# Altium footprint library Library 3D.PcbLib: 288 footprints (part 6 of 18)
Each footprint in its own frame and in the unit in brackets; x right, y up, seen from the top. Pads: shape width x height; smd on the part's side, far side on the other; paste and mask are expansions set on the pad; w line width, h text height; cw(c..) or ccw(c..) is an arc to the next point about the centre after c.
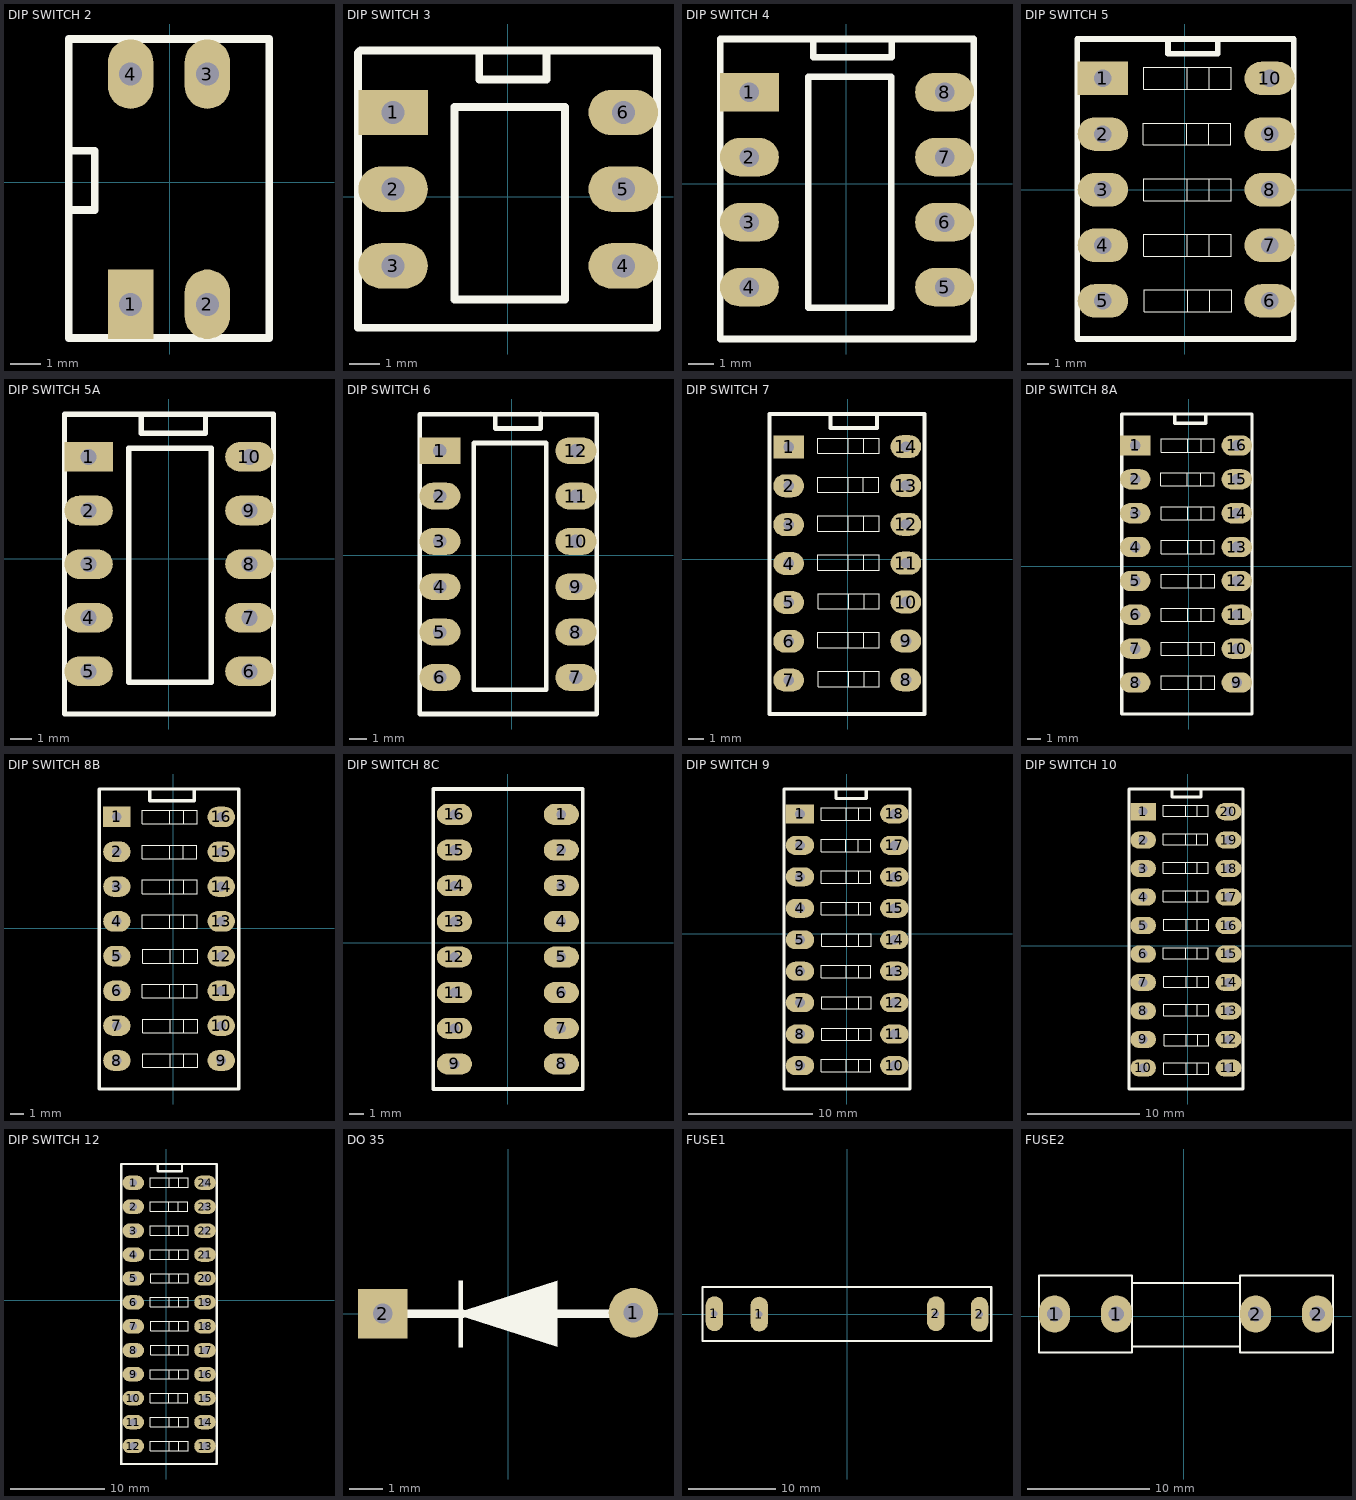
[diagram p5: the footprints below, top view; thin cyan lines are the x and y axes]

## DIP SWITCH 2 [mm]
pads (4):
  rect 1.5x2.3 hole 0.762: 1(-1.29,-4.04)
  oval 1.5x2.3 hole 0.762: 2(1.25,-4.04) 3(1.25,3.58) 4(-1.29,3.58)
Top Overlay:
  lines w0.254: -3.34,-0.916 -2.484,-0.916 -2.484,1.04 -3.34,1.04 ; -3.34,-5.154 -3.34,4.746 3.3,4.746 3.3,-5.154 -3.34,-5.154
3D body "DIP SWITCH 2.STEP": height 7.2, standoff -3, extent -3.34,-5.154 3.3,4.746

## DIP SWITCH 3 [mm]
pads (6):
  rect 2.3x1.5 hole 0.762: 1(-3.79,2.79)
  oval 2.3x1.5 hole 0.762: 2(-3.79,0.25) 3(-3.79,-2.29) 4(3.83,-2.29) 5(3.83,0.25) 6(3.83,2.79)
Top Overlay:
  lines w0.254: -0.945,4.797 -0.945,3.882 1.29,3.882 1.29,4.847 ; -4.955,-4.34 -4.955,4.759 -4.875,4.84 4.945,4.84 4.945,-4.34 -4.955,-4.34 ; -1.758,-3.408 -1.758,2.968 1.9,2.968 1.9,-3.408 -1.758,-3.408
3D body "DIP SWITCH 3.STEP": height 7.2, standoff -3, extent -4.955,-4.34 4.945,4.84

## DIP SWITCH 4 [mm]
pads (8):
  rect 2.3x1.5 hole 0.762: 1(-3.79,3.58)
  oval 2.3x1.5 hole 0.762: 2(-3.79,1.04) 3(-3.79,-1.5) 4(-3.79,-4.04) 5(3.83,-4.04) 6(3.83,-1.5) 7(3.83,1.04) 8(3.83,3.58)
Top Overlay:
  lines w0.254: -1.25,5.655 -1.301,5.604 -1.301,4.952 1.773,4.952 1.773,5.655 ; -4.93,-6.065 -4.93,5.655 4.97,5.655 4.97,-6.065 -4.93,-6.065 ; -1.5,-4.853 1.75,-4.853 1.75,4.19 -1.5,4.19 -1.5,-4.853
3D body "DIP SWITCH 4.STEP": height 7.2, standoff -3, extent -4.93,-6.065 4.97,5.655

## DIP SWITCH 5 [mm]
pads (10):
  rect 2.3x1.53 hole 0.8: 1(-3.75,5.08)
  oval 2.3x1.53 hole 0.8: 2(-3.75,2.54) 3(-3.75,0) 4(-3.75,-2.54) 5(-3.75,-5.08) 6(3.87,-5.08) 7(3.87,-2.54) 8(3.87,0) 9(3.87,2.54) 10(3.87,5.08)
Top Overlay:
  lines w0.038: 0.087,2.04 0.087,3.04 ; 0.112,-3.04 0.112,-2.04 ; 0.112,-0.5 0.112,0.5 ; 0.112,4.58 0.112,5.58 ; 0.137,-5.58 0.137,-4.58 ; 1.087,2.04 1.087,3.04 ; 1.112,-3.04 1.112,-2.04 ; 1.112,-0.5 1.112,0.5 ; 1.112,4.58 1.112,5.58 ; 1.137,-5.58 1.137,-4.58 ; -1.913,2.04 -1.913,3.04 2.087,3.04 2.087,2.04 -1.913,2.04 ; -1.888,-3.04 -1.888,-2.04 2.112,-2.04 2.112,-3.04 -1.888,-3.04 ; -1.888,-0.5 -1.888,0.5 2.112,0.5 2.112,-0.5 -1.888,-0.5 ; -1.888,4.58 -1.888,5.58 2.112,5.58 2.112,4.58 -1.888,4.58 ; -1.863,-5.58 -1.863,-4.58 2.137,-4.58 2.137,-5.58 -1.863,-5.58
  lines w0.254: -0.775,6.855 -0.775,6.205 1.5,6.205 1.5,6.88 ; -4.925,-6.82 -4.925,6.88 4.975,6.88 4.975,-6.82 -4.925,-6.82
3D body "User Library-DIP-8.STEP": height 7, standoff -3.7, extent -4.925,-6.82 4.975,6.88

## DIP SWITCH 5A [mm]
pads (10):
  rect 2.3x1.4 hole 0.762: 1(-3.79,4.83)
  oval 2.3x1.4 hole 0.762: 2(-3.79,2.29) 3(-3.79,-0.25) 4(-3.79,-2.79) 5(-3.79,-5.33) 6(3.83,-5.33) 7(3.83,-2.79) 8(3.83,-0.25) 9(3.83,2.29) 10(3.83,4.83)
Top Overlay:
  lines w0.254: -1.301,6.85 -1.301,5.948 1.747,5.948 1.747,6.862 ; -4.93,-7.35 4.97,-7.35 4.97,6.85 -4.93,6.85 -4.93,-7.35 ; -1.885,-5.838 2.027,-5.838 2.027,5.236 -1.885,5.236 -1.885,-5.838
3D body "DIP SWITCH 5.STEP": height 7.2, standoff -3, extent -4.93,-7.35 4.97,6.85

## DIP SWITCH 6 [mm]
pads (12):
  rect 2.3x1.5 hole 0.762: 1(-4.04,5.87)
  oval 2.3x1.5 hole 0.762: 2(-4.04,3.33) 3(-4.04,0.79) 4(-4.04,-1.75) 5(-4.04,-4.29) 6(-4.04,-6.83) 7(3.58,-6.83) 8(3.58,-4.29) 9(3.58,-1.75) 10(3.58,0.79) 11(3.58,3.33) 12(3.58,5.87)
Top Overlay:
  lines w0.254: -0.941,7.902 -0.941,7.115 1.624,7.115 1.624,7.927 ; -5.155,-8.88 4.746,-8.88 4.746,7.92 -5.155,7.92 -5.155,-8.88 ; -2.135,-7.516 1.929,-7.516 1.929,6.302 -2.135,6.302 -2.135,-7.516
3D body "DIP SWITCH 6.STEP": height 7.2, standoff -3, extent -5.155,-8.88 4.746,7.92

## DIP SWITCH 7 [mm]
pads (14):
  rect 2x1.5 hole 0.7: 1(-3.875,7.35)
  oval 2x1.5 hole 0.7: 2(-3.875,4.81) 3(-3.875,2.27) 4(-3.875,-0.27) 5(-3.875,-2.81) 6(-3.875,-5.35) 7(-3.875,-7.89) 8(3.79,-7.87) 9(3.79,-5.33) 10(3.79,-2.79) 11(3.79,-0.25) 12(3.79,2.29) 13(3.79,4.83) 14(3.79,7.37)
Top Overlay:
  lines w0.038: 0.012,4.385 0.012,5.385 ; 0.037,-5.775 0.037,-4.775 ; 0.037,-0.695 0.037,0.305 ; 0.037,1.845 0.037,2.845 ; 0.037,6.925 0.037,7.925 ; 0.062,-8.315 0.062,-7.315 ; 0.062,-3.235 0.062,-2.235 ; 1.012,4.385 1.012,5.385 ; 1.037,-5.775 1.037,-4.775 ; 1.037,-0.695 1.037,0.305 ; 1.037,1.845 1.037,2.845 ; 1.037,6.925 1.037,7.925 ; 1.062,-8.315 1.062,-7.315 ; 1.062,-3.235 1.062,-2.235 ; -1.988,4.385 2.012,4.385 2.012,5.385 -1.988,5.385 -1.988,4.385 ; -1.963,-5.775 2.037,-5.775 2.037,-4.775 -1.963,-4.775 -1.963,-5.775 ; -1.963,-0.695 2.037,-0.695 2.037,0.305 -1.963,0.305 -1.963,-0.695 ; -1.963,1.845 2.037,1.845 2.037,2.845 -1.963,2.845 -1.963,1.845 ; -1.963,6.925 2.037,6.925 2.037,7.925 -1.963,7.925 -1.963,6.925 ; -1.938,-8.315 2.062,-8.315 2.062,-7.315 -1.938,-7.315 -1.938,-8.315 ; -1.938,-3.235 2.062,-3.235 2.062,-2.235 -1.938,-2.235 -1.938,-3.235
  lines w0.254: -1.15,9.35 -1.15,8.6 1.9,8.6 1.9,9.325 ; -5.13,-10.105 -5.13,9.504 5.009,9.504 5.009,-10.105 -5.13,-10.105
3D body "DIP SWITCH 7.STEP": height 7.2, standoff -3, extent -4.995,-9.945 4.905,9.394

## DIP SWITCH 8A [mm]
pads (16):
  rect 2.286x1.524 hole 0.8: 1(-4,9.075)
  oval 2.286x1.524 hole 0.8: 2(-4,6.535) 3(-4,3.995) 4(-4,1.455) 5(-4,-1.085) 6(-4,-3.625) 7(-4,-6.165) 8(-4,-8.705) 9(3.62,-8.705) 10(3.62,-6.165) 11(3.62,-3.625) 12(3.62,-1.085) 13(3.62,1.455) 14(3.62,3.995) 15(3.62,6.535) 16(3.62,9.075)
Top Overlay:
  lines w0.038: -0.088,6.035 -0.088,7.035 ; -0.063,-4.125 -0.063,-3.125 ; -0.063,0.955 -0.063,1.955 ; -0.063,3.495 -0.063,4.495 ; -0.063,8.575 -0.063,9.575 ; -0.038,-9.205 -0.038,-8.205 ; -0.038,-6.665 -0.038,-5.665 ; -0.038,-1.585 -0.038,-0.585 ; 0.912,6.035 0.912,7.035 ; 0.937,-4.125 0.937,-3.125 ; 0.937,0.955 0.937,1.955 ; 0.937,3.495 0.937,4.495 ; 0.937,8.575 0.937,9.575 ; 0.962,-9.205 0.962,-8.205 ; 0.962,-6.665 0.962,-5.665 ; 0.962,-1.585 0.962,-0.585 ; -2.088,6.035 -2.088,7.035 1.912,7.035 1.912,6.035 -2.088,6.035 ; -2.063,-4.125 -2.063,-3.125 1.937,-3.125 1.937,-4.125 -2.063,-4.125 ; -2.063,0.955 -2.063,1.955 1.937,1.955 1.937,0.955 -2.063,0.955 ; -2.063,3.495 -2.063,4.495 1.937,4.495 1.937,3.495 -2.063,3.495 ; -2.063,8.575 -2.063,9.575 1.937,9.575 1.937,8.575 -2.063,8.575 ; -2.038,-9.205 -2.038,-8.205 1.962,-8.205 1.962,-9.205 -2.038,-9.205 ; -2.038,-6.665 -2.038,-5.665 1.962,-5.665 1.962,-6.665 -2.038,-6.665 ; -2.038,-1.585 -2.038,-0.585 1.962,-0.585 1.962,-1.585 -2.038,-1.585
  lines w0.254: -1.025,11.435 -1.025,10.75 1.3,10.75 1.3,11.4 ; -5.016,-11.065 -5.016,11.435 4.764,11.435 4.764,-11.065 -5.016,-11.065
3D body "SW3dPS-DIP SWITCH 8 POS CTS 206.STEP": height 8.25, standoff -3.5, extent -5.016,-11.065 4.764,11.435

## DIP SWITCH 8B [mm]
pads (16):
  rect 2x1.5 hole 0.7: 1(-4.13,8.13)
  oval 2x1.5 hole 0.7: 2(-4.13,5.59) 3(-4.13,3.05) 4(-4.13,0.51) 5(-4.13,-2.03) 6(-4.13,-4.57) 7(-4.13,-7.11) 8(-4.13,-9.65) 9(3.49,-9.65) 10(3.49,-7.11) 11(3.49,-4.57) 12(3.49,-2.03) 13(3.49,0.51) 14(3.49,3.05) 15(3.49,5.59) 16(3.49,8.13)
Top Overlay:
  lines w0.038: -0.288,5.08 -0.288,6.08 ; -0.263,-5.08 -0.263,-4.08 ; -0.263,0 -0.263,1 ; -0.263,2.54 -0.263,3.54 ; -0.263,7.62 -0.263,8.62 ; -0.238,-10.16 -0.238,-9.16 ; -0.238,-7.62 -0.238,-6.62 ; -0.238,-2.54 -0.238,-1.54 ; 0.712,5.08 0.712,6.08 ; 0.737,-5.08 0.737,-4.08 ; 0.737,0 0.737,1 ; 0.737,2.54 0.737,3.54 ; 0.737,7.62 0.737,8.62 ; 0.762,-10.16 0.762,-9.16 ; 0.762,-7.62 0.762,-6.62 ; 0.762,-2.54 0.762,-1.54 ; -2.288,5.08 -2.288,6.08 1.712,6.08 1.712,5.08 -2.288,5.08 ; -2.263,-5.08 -2.263,-4.08 1.737,-4.08 1.737,-5.08 -2.263,-5.08 ; -2.263,0 -2.263,1 1.737,1 1.737,0 -2.263,0 ; -2.263,2.54 -2.263,3.54 1.737,3.54 1.737,2.54 -2.263,2.54 ; -2.263,7.62 -2.263,8.62 1.737,8.62 1.737,7.62 -2.263,7.62 ; -2.238,-10.16 -2.238,-9.16 1.762,-9.16 1.762,-10.16 -2.238,-10.16 ; -2.238,-7.62 -2.238,-6.62 1.762,-6.62 1.762,-7.62 -2.238,-7.62 ; -2.238,-2.54 -2.238,-1.54 1.762,-1.54 1.762,-2.54 -2.238,-2.54
  lines w0.254: -1.725,10.17 -1.725,9.32 1.525,9.32 1.525,10.17 ; -5.405,-11.73 -5.405,10.17 4.755,10.17 4.755,-11.73 -5.405,-11.73
3D body "User Library-DIPSWITCH8.STEP": height 6.9, standoff -3.2, extent -5.405,-11.73 4.755,10.17

## DIP SWITCH 8C [mm]
pads (16):
  oval 2.5x1.5 hole 0.7: 1(3.81,9.14) 2(3.81,6.6) 3(3.81,4.06) 4(3.81,1.52) 5(3.81,-1.02) 6(3.81,-3.56) 7(3.81,-6.1) 8(3.81,-8.64) 9(-3.81,-8.64) 10(-3.81,-6.1) 11(-3.81,-3.56) 12(-3.81,-1.02) 13(-3.81,1.52) 14(-3.81,4.06) 15(-3.81,6.6) 16(-3.81,9.14)
Top Overlay:
  lines w0.254: -5.325,-10.425 5.35,-10.425 5.35,10.95 -5.325,10.95 -5.325,-10.425
3D body "SW8.STEP": height 6.5, standoff -3, extent -4.75,-10.25 4.75,10.75

## DIP SWITCH 9 [mm]
pads (18):
  rect 2.3x1.53 hole 0.8: 1(-3.762,9.67)
  oval 2.3x1.53 hole 0.8: 2(-3.762,7.13) 3(-3.762,4.59) 4(-3.762,2.05) 5(-3.762,-0.49) 6(-3.762,-3.03) 7(-3.762,-5.57) 8(-3.762,-8.11) 9(-3.762,-10.65) 10(3.858,-10.65) 11(3.858,-8.11) 12(3.858,-5.57) 13(3.858,-3.03) 14(3.858,-0.49) 15(3.858,2.05) 16(3.858,4.59) 17(3.858,7.13) 18(3.858,9.67)
Top Overlay:
  lines w0.038: -0.051,6.62 -0.051,7.62 ; -0.025,-11.14 -0.025,-10.14 ; -0.025,-3.54 -0.025,-2.54 ; -0.025,1.54 -0.025,2.54 ; -0.025,4.08 -0.025,5.08 ; -0.025,9.16 -0.025,10.16 ; 0,-8.62 0,-7.62 ; 0,-6.08 0,-5.08 ; 0,-1 0,0 ; 0.949,6.62 0.949,7.62 ; 0.975,-11.14 0.975,-10.14 ; 0.975,-3.54 0.975,-2.54 ; 0.975,1.54 0.975,2.54 ; 0.975,4.08 0.975,5.08 ; 0.975,9.16 0.975,10.16 ; 1,-8.62 1,-7.62 ; 1,-6.08 1,-5.08 ; 1,-1 1,0 ; -2.051,6.62 1.949,6.62 1.949,7.62 -2.051,7.62 -2.051,6.62 ; -2.025,-11.14 1.975,-11.14 1.975,-10.14 -2.025,-10.14 -2.025,-11.14 ; -2.025,-3.54 1.975,-3.54 1.975,-2.54 -2.025,-2.54 -2.025,-3.54 ; -2.025,1.54 1.975,1.54 1.975,2.54 -2.025,2.54 -2.025,1.54 ; -2.025,4.08 1.975,4.08 1.975,5.08 -2.025,5.08 -2.025,4.08 ; -2.025,9.16 1.975,9.16 1.975,10.16 -2.025,10.16 -2.025,9.16 ; -2,-8.62 2,-8.62 2,-7.62 -2,-7.62 -2,-8.62 ; -2,-6.08 2,-6.08 2,-5.08 -2,-5.08 -2,-6.08 ; -2,-1 2,-1 2,0 -2,0 -2,-1
  lines w0.254: -0.837,11.635 -0.837,10.91 1.563,10.91 1.588,10.935 1.588,11.68 ; -5.042,11.68 5.118,11.68 5.118,-12.54 -5.042,-12.54 -5.042,11.68 ; -5.042,11.68 -5.042,11.68
3D body "User Library-DIPSWITCH9.STEP": height 6.9, standoff -3.2, extent -5.042,-12.54 5.118,11.68

## DIP SWITCH 10 [mm]
pads (20):
  rect 2.3x1.53 hole 0.8: 1(-4,11.95)
  oval 2.3x1.53 hole 0.8: 2(-4,9.41) 3(-4,6.87) 4(-4,4.33) 5(-4,1.79) 6(-4,-0.75) 7(-4,-3.29) 8(-4,-5.83) 9(-4,-8.37) 10(-4,-10.91) 11(3.62,-10.91) 12(3.62,-8.37) 13(3.62,-5.83) 14(3.62,-3.29) 15(3.62,-0.75) 16(3.62,1.79) 17(3.62,4.33) 18(3.62,6.87) 19(3.62,9.41) 20(3.62,11.95)
Top Overlay:
  lines w0.038: -0.213,8.985 -0.213,9.985 ; -0.188,-1.175 -0.188,-0.175 ; -0.188,3.905 -0.188,4.905 ; -0.188,6.445 -0.188,7.445 ; -0.188,11.525 -0.188,12.525 ; -0.163,-11.465 -0.163,-10.465 ; -0.163,-6.255 -0.163,-5.255 ; -0.163,-3.715 -0.163,-2.715 ; -0.163,1.365 -0.163,2.365 ; -0.138,-8.925 -0.138,-7.925 ; 0.787,8.985 0.787,9.985 ; 0.812,-1.175 0.812,-0.175 ; 0.812,3.905 0.812,4.905 ; 0.812,6.445 0.812,7.445 ; 0.812,11.525 0.812,12.525 ; 0.837,-11.465 0.837,-10.465 ; 0.837,-6.255 0.837,-5.255 ; 0.837,-3.715 0.837,-2.715 ; 0.837,1.365 0.837,2.365 ; 0.862,-8.925 0.862,-7.925 ; -2.213,8.985 -2.213,9.985 1.787,9.985 1.787,8.985 -2.213,8.985 ; -2.188,-1.175 -2.188,-0.175 1.812,-0.175 1.812,-1.175 -2.188,-1.175 ; -2.188,3.905 -2.188,4.905 1.812,4.905 1.812,3.905 -2.188,3.905 ; -2.188,6.445 -2.188,7.445 1.812,7.445 1.812,6.445 -2.188,6.445 ; -2.188,11.525 -2.188,12.525 1.812,12.525 1.812,11.525 -2.188,11.525 ; -2.163,-11.465 1.837,-11.465 1.837,-10.465 -2.163,-10.465 -2.163,-11.465 ; -2.163,-6.255 -2.163,-5.255 1.837,-5.255 1.837,-6.255 -2.163,-6.255 ; -2.163,-3.715 -2.163,-2.715 1.837,-2.715 1.837,-3.715 -2.163,-3.715 ; -2.163,1.365 -2.163,2.365 1.837,2.365 1.837,1.365 -2.163,1.365 ; -2.138,-8.925 1.862,-8.925 1.862,-7.925 -2.138,-7.925 -2.138,-8.925
  lines w0.254: -1.425,13.975 -1.425,13.25 1.15,13.25 1.15,13.96 ; -5.255,-12.8 -5.255,13.96 ; -5.255,-12.8 -5.255,-12.8 ; -5.255,-12.8 4.905,-12.8 4.905,13.96 -5.255,13.96 ; -5.255,13.96 -5.255,13.96
3D body "User Library-DIPSWITCH10.STEP": height 6.9, standoff -3.2, extent -5.255,-12.8 4.905,13.96

## DIP SWITCH 12 [mm]
pads (24):
  oval 2.3x1.53 hole 0.8: 1(-3.5,12.45) 2(-3.5,9.91) 3(-3.5,7.37) 4(-3.5,4.83) 5(-3.5,2.29) 6(-3.5,-0.25) 7(-3.5,-2.79) 8(-3.5,-5.33) 9(-3.5,-7.87) 10(-3.5,-10.41) 11(-3.5,-12.95) 12(-3.5,-15.49) 13(4.12,-15.49) 14(4.12,-12.95) 15(4.12,-10.41) 16(4.12,-7.87) 17(4.12,-5.33) 18(4.12,-2.79) 19(4.12,-0.25) 20(4.12,2.29) 21(4.12,4.83) 22(4.12,7.37) 23(4.12,9.91) 24(4.12,12.45)
Top Overlay:
  lines w0.038: 0.287,-10.915 0.287,-9.915 ; 0.287,9.435 0.287,10.435 ; 0.312,-15.995 0.312,-14.995 ; 0.312,-13.455 0.312,-12.455 ; 0.312,-8.375 0.312,-7.375 ; 0.312,-0.725 0.312,0.275 ; 0.312,4.355 0.312,5.355 ; 0.312,6.895 0.312,7.895 ; 0.312,11.975 0.312,12.975 ; 0.337,-5.805 0.337,-4.805 ; 0.337,-3.265 0.337,-2.265 ; 0.337,1.815 0.337,2.815 ; 1.287,-10.915 1.287,-9.915 ; 1.287,9.435 1.287,10.435 ; 1.312,-15.995 1.312,-14.995 ; 1.312,-13.455 1.312,-12.455 ; 1.312,-8.375 1.312,-7.375 ; 1.312,-0.725 1.312,0.275 ; 1.312,4.355 1.312,5.355 ; 1.312,6.895 1.312,7.895 ; 1.312,11.975 1.312,12.975 ; 1.337,-5.805 1.337,-4.805 ; 1.337,-3.265 1.337,-2.265 ; 1.337,1.815 1.337,2.815 ; -1.713,-10.915 2.287,-10.915 2.287,-9.915 -1.713,-9.915 -1.713,-10.915 ; -1.713,9.435 2.287,9.435 2.287,10.435 -1.713,10.435 -1.713,9.435 ; -1.688,-15.995 2.312,-15.995 2.312,-14.995 -1.688,-14.995 -1.688,-15.995 ; -1.688,-13.455 2.312,-13.455 2.312,-12.455 -1.688,-12.455 -1.688,-13.455 ; -1.688,-8.375 2.312,-8.375 2.312,-7.375 -1.688,-7.375 -1.688,-8.375 ; -1.688,-0.725 2.312,-0.725 2.312,0.275 -1.688,0.275 -1.688,-0.725 ; -1.688,4.355 2.312,4.355 2.312,5.355 -1.688,5.355 -1.688,4.355 ; -1.688,6.895 2.312,6.895 2.312,7.895 -1.688,7.895 -1.688,6.895 ; -1.688,11.975 2.312,11.975 2.312,12.975 -1.688,12.975 -1.688,11.975 ; -1.663,-5.805 2.337,-5.805 2.337,-4.805 -1.663,-4.805 -1.663,-5.805 ; -1.663,-3.265 2.337,-3.265 2.337,-2.265 -1.663,-2.265 -1.663,-3.265 ; -1.663,1.815 2.337,1.815 2.337,2.815 -1.663,2.815 -1.663,1.815
  lines w0.254: -0.9,14.4 -0.9,13.725 -0.825,13.65 1.675,13.65 1.675,14.44 ; -4.785,-17.4 -4.785,14.44 ; -4.785,-17.4 -4.785,-17.4 ; -4.785,-17.4 5.375,-17.4 5.375,14.44 -4.785,14.44 ; -4.785,14.44 -4.785,14.44
3D body "User Library-DIPSWITCH12.STEP": height 6.9, standoff -3.2, extent -4.785,-17.4 5.375,14.44

## DO 35 [mm]
pads (2):
  round 1.5 hole 0.6: 1(3.8,0.025)
  rect 1.5x1.5 hole 0.6: 2(-3.8,0)
Top Overlay:
  region: 1.5,1 1.5,-1 -1.625,0
  region: -1.5,1 -1.5,-1.025 -1.375,-1.025 -1.375,1
  lines w0.254: -3.8,0 -1.375,0 ; 1.5,0 3.5,0
3D body "User Library-DO-204AH (DO-35).STEP": height 2.21, standoff -1.8, extent -4.07,-1.01 4.07,1.01

## FUSE1 [mm]
pads (4):
  oval 2x4 hole 0.762 square: 1(-15.275,0.05) 1(-10.125,0) 2(10.175,0.05) 2(15.2,-0.025)
Top Overlay:
  lines w0.254: -16.65,-3.075 -16.65,3.1 16.55,3.1 16.55,-3.075 -16.65,-3.075
3D body "SW3DPS-FUSE-DEFAULT.STEP": height 9.34, standoff -3.51, extent -15.44,-2.952 15.44,2.952

## FUSE2 [mm]
pads (4):
  oval 2.54x3.048 hole 1.27: 1(-10.595,0.175) 1(-5.515,0.175) 2(5.915,0.175) 2(10.995,0.175)
Top Overlay:
  lines w0.178: -4.245,-2.492 4.645,-2.492 ; -4.245,2.715 4.645,2.715 ; -11.865,-3 -11.865,3.35 -4.245,3.35 -4.245,-3 -11.865,-3 ; 4.645,-3 12.265,-3 12.265,3.35 4.645,3.35 4.645,-3
3D body "SW3dPS-Fuse Leg_2009.STEP": height 9.6, standoff -3.3, extent 5.763,-2.789 11.859,3.401
3D body "SW3dPS-Fuse Small 1A.STEP": height 9.41, standoff 4.31, extent -9.574,-2.314 10.126,2.786
3D body "SW3dPS-Fuse Leg_2009.STEP": height 9.6, standoff -3.3, extent -11.179,-2.797 -5.083,3.393